# Altium footprint library Connectors.PcbLib: 67 footprints (part 4 of 5)
Each footprint in its own frame and in the unit in brackets; x right, y up, seen from the top. Pads: shape width x height; smd on the part's side, far side on the other; paste and mask are expansions set on the pad; w line width, h text height; cw(c..) or ccw(c..) is an arc to the next point about the centre after c.
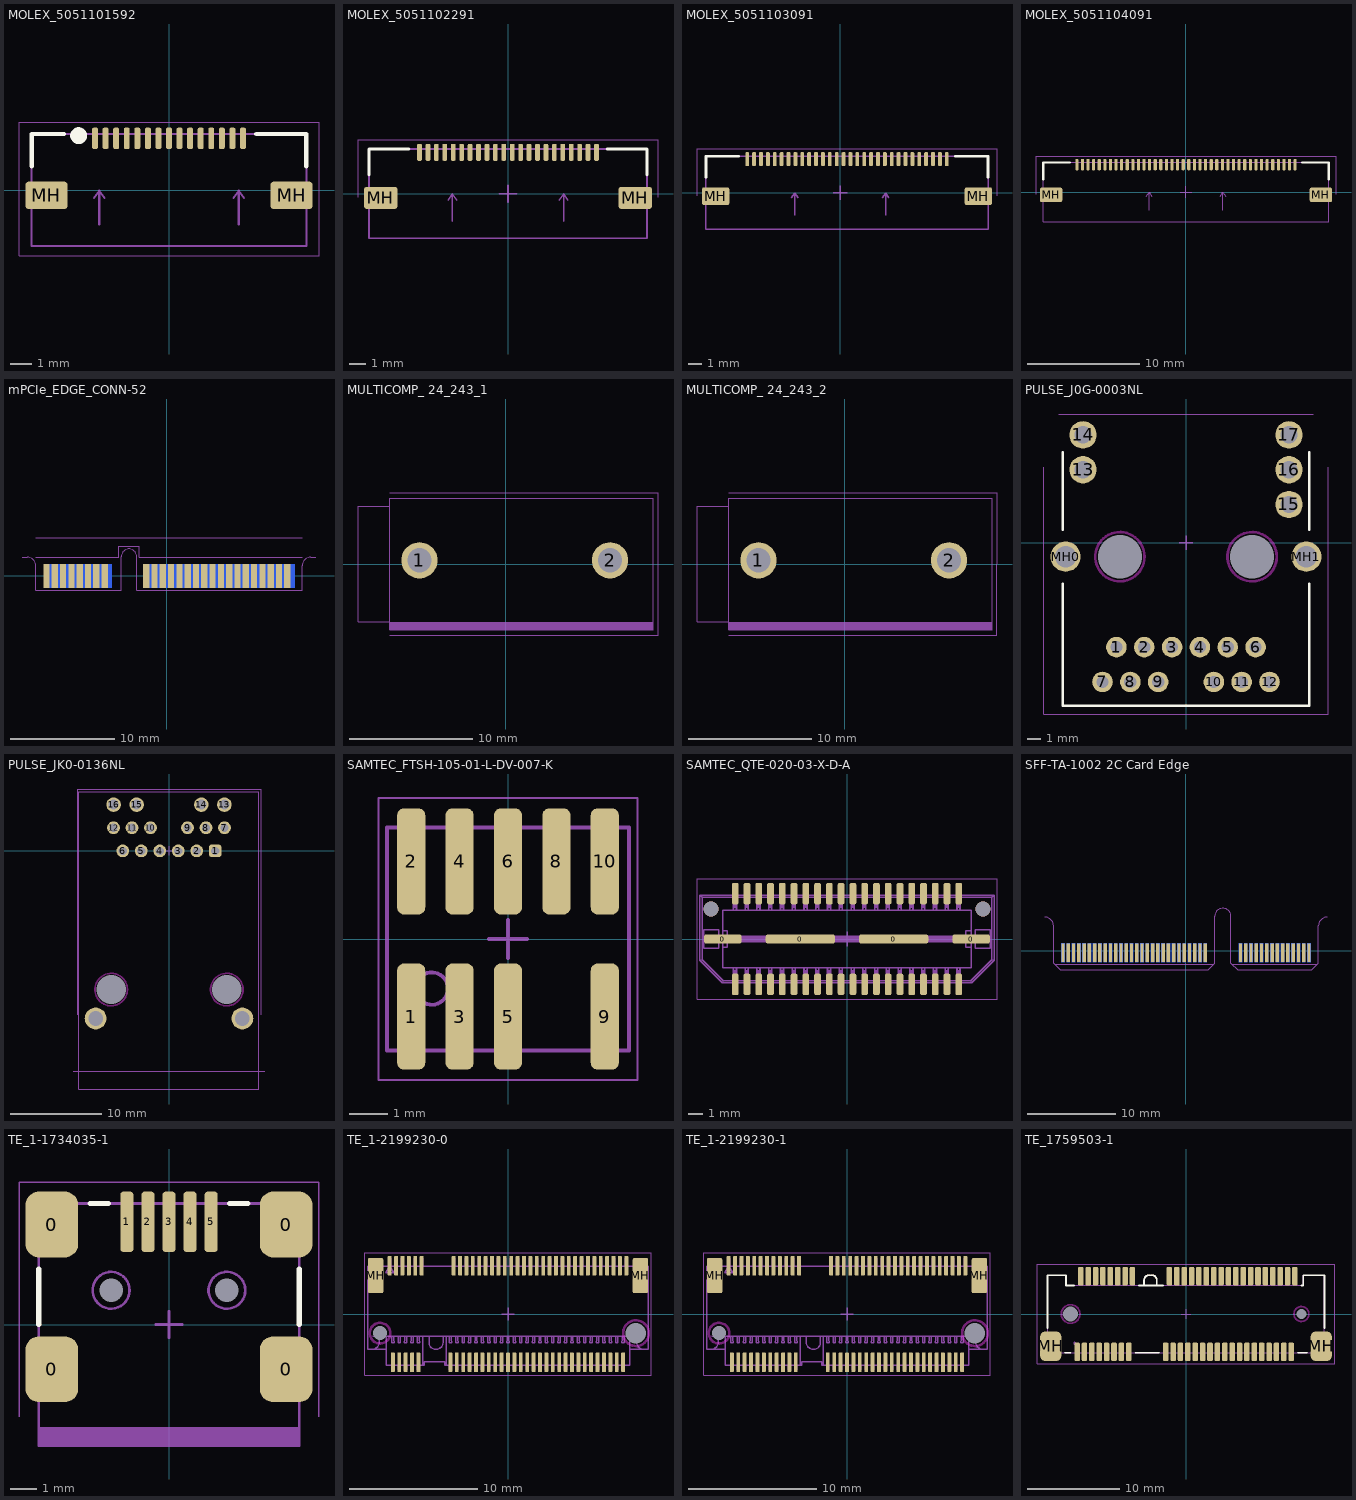
[diagram p3: the footprints below, top view; thin cyan lines are the x and y axes]

## MOLEX_5051101592 [mm]
pads (17):
  rrect50% 0.28x1 smd mask+0.05: 1(-3.5,2.45) 2(-3,2.45) 3(-2.5,2.45) 4(-2,2.45) 5(-1.5,2.45) 6(-1,2.45) 7(-0.5,2.45) 8(0,2.45) 9(0.5,2.45) 10(1,2.45) 11(1.5,2.45) 12(2,2.45) 13(2.5,2.45) 14(3,2.45) 15(3.5,2.45)
  rrect25% 2x1.3 smd mask+0.05: MH(-5.8,-0.25) MH(5.8,-0.25)
Top Overlay:
  circle w0.4: c-4.275,2.575 r0.2
  lines w0.2: -6.5,1.125 -6.5,2.65 -4.975,2.65 ; 4.125,2.65 6.5,2.65 6.5,1.125
Top Assembly:
  lines w0.1: -3.55,-0.375 -3.3,-0.025 ; -3.3,-1.625 -3.3,-0.025 ; -3.05,-0.375 -3.3,-0.025 ; 3.05,-0.375 3.3,-0.025 ; 3.3,-1.625 3.3,-0.025 ; 3.55,-0.375 3.3,-0.025 ; -6.5,-2.65 6.5,-2.65 6.5,2.65 -6.5,2.65 -6.5,-2.65
  text ".Designator" at -5.835,-0.571 h1.6
Top Courtyard (Mech13):
  lines w0.05: -7.1,-3.1 -7.1,3.2 7.1,3.2 7.1,-3.1 -7.1,-3.1
3D body "5051101592.stp": height 1.88, standoff -0.02, extent -6.5,-2.65 6.5,2.65

## MOLEX_5051102291 [mm]
height 1.9
pads (24):
  rrect50% 0.28x1 smd mask+0.05: 1(-5.25,2.45) 2(-4.75,2.45) 3(-4.25,2.45) 4(-3.75,2.45) 5(-3.25,2.45) 6(-2.75,2.45) 7(-2.25,2.45) 8(-1.75,2.45) 9(-1.25,2.45) 10(-0.75,2.45) 11(-0.25,2.45) 12(0.25,2.45) 13(0.75,2.45) 14(1.25,2.45) 15(1.75,2.45) 16(2.25,2.45) 17(2.75,2.45) 18(3.25,2.45) 19(3.75,2.45) 20(4.25,2.45) 21(4.75,2.45) 22(5.25,2.45)
  rrect25% 2x1.3 smd mask+0.05: MH(-7.55,-0.25) MH(7.55,-0.25)
Top Overlay:
  lines w0.2: -8.25,1.125 -8.25,2.65 -5.875,2.65 ; 5.875,2.65 8.25,2.65 8.25,1.125
Top Assembly:
  lines w0.1: -3.55,-0.375 -3.3,-0.025 ; -3.3,-1.625 -3.3,-0.025 ; -3.05,-0.375 -3.3,-0.025 ; 3.05,-0.375 3.3,-0.025 ; 3.3,-1.625 3.3,-0.025 ; 3.55,-0.375 3.3,-0.025 ; -8.25,-2.65 -8.25,2.65 8.25,2.65 8.25,-2.65 -8.25,-2.65
  text ".Designator" at -5.835,-0.571 h1.6
Top Courtyard (Mech13):
  lines w0.05: -8.9,-0.2 -8.9,3.2 8.9,3.2 8.9,-0.2
  lines w0.1: -0.5,0 0.5,0 ; 0,-0.5 0,0.5
3D body "5051102291.stp": height 1.88, standoff -0.02, extent -8.25,-2.65 8.25,2.65

## MOLEX_5051103091 [mm]
pads (32):
  rrect50% 0.28x1 smd mask+0.05: 1(-6.75,2.45) 2(-6.25,2.45) 3(-5.75,2.45) 4(-5.25,2.45) 5(-4.75,2.45) 6(-4.25,2.45) 7(-3.75,2.45) 8(-3.25,2.45) 9(-2.75,2.45) 10(-2.25,2.45) 11(-1.75,2.45) 12(-1.25,2.45) 13(-0.75,2.45) 14(-0.25,2.45) 15(0.25,2.45) 16(0.75,2.45) 17(1.25,2.45) 18(1.75,2.45) 19(2.25,2.45) 20(2.75,2.45) 21(3.25,2.45) 22(3.75,2.45) 23(4.25,2.45) 24(4.75,2.45) 25(5.25,2.45) 26(5.75,2.45) 27(6.25,2.45) 28(6.75,2.45) 29(7.25,2.45) 30(7.75,2.45)
  rrect25% 2x1.3 smd mask+0.05: MH(-9.05,-0.25) MH(10.05,-0.25)
Top Overlay:
  lines w0.2: -9.75,1.125 -9.75,2.65 -7.375,2.65 ; 8.375,2.65 10.75,2.65 10.75,1.125
Top Assembly:
  lines w0.1: -3.55,-0.375 -3.3,-0.025 ; -3.3,-1.625 -3.3,-0.025 ; -3.05,-0.375 -3.3,-0.025 ; 3.05,-0.375 3.3,-0.025 ; 3.3,-1.625 3.3,-0.025 ; 3.55,-0.375 3.3,-0.025 ; -9.75,-2.65 -9.75,2.65 10.75,2.65 10.75,-2.65 -9.75,-2.65
  text ".Designator" at -5.835,-0.571 h1.6
Top Courtyard (Mech13):
  lines w0.05: -10.4,-0.2 -10.4,3.2 11.4,3.2 11.4,-0.2
  lines w0.1: -0.5,0 0.5,0 ; 0,-0.5 0,0.5
3D body "5051103091.stp": height 1.88, standoff -0.02, extent -9.75,-2.65 10.75,2.65

## MOLEX_5051104091 [mm]
pads (42):
  rrect50% 0.28x1 smd mask+0.05: 1(-9.75,2.45) 2(-9.25,2.45) 3(-8.75,2.45) 4(-8.25,2.45) 5(-7.75,2.45) 6(-7.25,2.45) 7(-6.75,2.45) 8(-6.25,2.45) 9(-5.75,2.45) 10(-5.25,2.45) 11(-4.75,2.45) 12(-4.25,2.45) 13(-3.75,2.45) 14(-3.25,2.45) 15(-2.75,2.45) 16(-2.25,2.45) 17(-1.75,2.45) 18(-1.25,2.45) 19(-0.75,2.45) 20(-0.25,2.45) 21(0.25,2.45) 22(0.75,2.45) 23(1.25,2.45) 24(1.75,2.45) 25(2.25,2.45) 26(2.75,2.45) 27(3.25,2.45) 28(3.75,2.45) 29(4.25,2.45) 30(4.75,2.45) 31(5.25,2.45) 32(5.75,2.45) 33(6.25,2.45) 34(6.75,2.45) 35(7.25,2.45) 36(7.75,2.45) 37(8.25,2.45) 38(8.75,2.45) 39(9.25,2.45) 40(9.75,2.45)
  rrect25% 2x1.3 smd mask+0.05: MH(-12.05,-0.25) MH(12.05,-0.25)
Top Overlay:
  lines w0.2: -12.75,1.125 -12.75,2.65 -10.375,2.65 ; 10.375,2.65 12.75,2.65 12.75,1.125
Top Assembly:
  lines w0.1: -3.55,-0.375 -3.3,-0.025 ; -3.3,-1.625 -3.3,-0.025 ; -3.05,-0.375 -3.3,-0.025 ; 3.05,-0.375 3.3,-0.025 ; 3.3,-1.625 3.3,-0.025 ; 3.55,-0.375 3.3,-0.025 ; -12.75,-2.65 12.75,-2.65 12.75,2.65 -12.75,2.65 -12.75,-2.65
  text ".Designator" at -5.835,-0.571 h1.6
Top Courtyard (Mech13):
  lines w0.05: -13.4,-0.2 -13.4,3.2 13.4,3.2 13.4,-0.2
  lines w0.1: -0.5,0 0.5,0 ; 0,-0.5 0,0.5
3D body "5051104091.stp": height 1.88, standoff -0.02, extent -12.75,-2.65 12.75,2.65

## mPCIe_EDGE_CONN-52 [mm]
pads (52):
  rect 0.6x2.3 smd paste-10 mask+0.05: 1(-11.6,0) 3(-10.8,0) 5(-10,0) 7(-9.2,0) 9(-8.4,0) 11(-7.6,0) 13(-6.8,0) 15(-6,0) 17(-2,0) 19(-1.2,0) 21(-0.4,0) 23(0.4,0) 25(1.2,0) 27(2,0) 29(2.8,0) 31(3.6,0) 33(4.4,0) 35(5.2,0) 37(6,0) 39(6.8,0) 41(7.6,0) 43(8.4,0) 45(9.2,0) 47(10,0) 49(10.8,0) 51(11.6,0)
  rect 0.6x2.3 smd far side paste-10 mask+0.05: 2(-11.2,0) 4(-10.4,0) 6(-9.6,0) 8(-8.8,0) 10(-8,0) 12(-7.2,0) 14(-6.4,0) 16(-5.6,0) 18(-1.6,0) 20(-0.8,0) 22(0,0) 24(0.8,0) 26(1.6,0) 28(2.4,0) 30(3.2,0) 32(4,0) 34(4.8,0) 36(5.6,0) 38(6.4,0) 40(7.2,0) 42(8,0) 44(8.8,0) 46(9.6,0) 48(10.4,0) 50(11.2,0) 52(12,0)
Board:
  lines w0.05: -13.95,1.8 -13.45,1.8 cw(c-13.45,1) -12.65,1 ; 14.35,1.8 13.85,1.8 ccw(c13.85,1) 13.05,1 13.05,-1.4 -2.9,-1.4 -2.9,1.85 ccw(c-3.65,1.85) -4.4,1.85 -4.4,-1.4 -12.65,-1.4 -12.65,1 ; -12.65,1 -12.65,1
Top Courtyard (Mech13):
  lines w0.05: -12.65,3.7 13.05,3.7
Bottom Courtyard:
  lines w0.05: -12.65,1.8 -4.65,1.8 -4.65,2.85 -2.65,2.85 -2.65,1.8 13.05,1.8

## MULTICOMP_ 24_243_1 [mm]
height 0.3
pads (2):
  round 2.955 hole 1.97: 1(-7,0.3) 2(8.5,0.3)
Top Assembly:
  region: -9.4,-4.75 -9.4,-5.35 12,-5.35 12,-4.75
  lines w0.1: -9.4,-4.75 12,-4.75 ; -9.4,-4.7 -12,-4.7 -12,4.7 -9.4,4.7 ; -9.4,-5.35 -9.4,5.35 12,5.35 12,-5.35 -9.4,-5.35
  text ".Designator" at -0.346,0.121 h1
Top Courtyard (Mech13):
  lines w0.05: -9.4,-5.8 12.4,-5.8 12.4,5.8 -9.4,5.8
3D body "User Library-Multicomp_24_243_1.step": height 13, standoff -6, extent -12,-5.35 12,5.35

## MULTICOMP_ 24_243_2 [mm]
height 0.3
pads (2):
  round 2.955 hole 1.97: 1(-7,0.3) 2(8.5,0.3)
Top Assembly:
  region: -9.4,-4.75 -9.4,-5.35 12,-5.35 12,-4.75
  lines w0.1: -9.4,-4.75 12,-4.75 ; -9.4,-4.7 -12,-4.7 -12,4.7 -9.4,4.7 ; -9.4,-5.35 -9.4,5.35 12,5.35 12,-5.35 -9.4,-5.35
  text ".Designator" at -0.346,0.121 h1
Top Courtyard (Mech13):
  lines w0.05: -9.4,-5.8 12.4,-5.8 12.4,5.8 -9.4,5.8
3D body "User Library-Multicomp_24_243_2.step": height 13, standoff -6, extent -12,-5.35 12,5.35

## PULSE_J0G-0003NL [mm]
height 11.68
pads (21):
  round 0 hole 3.2 unplated mask+0.1: 0(-4.826,-1.016) 0(4.826,-1.016)
  round 1.5 hole 0.89 mask+0.05: 1(-5.08,-7.62) 2(-3.048,-7.62) 3(-1.016,-7.62) 4(1.016,-7.62) 5(3.048,-7.62) 6(5.08,-7.62) 7(-6.096,-10.16) 8(-4.064,-10.16) 9(-2.032,-10.16) 10(2.032,-10.16) 11(4.064,-10.16) 12(6.096,-10.16)
  round 2 hole 1.27 mask+0.05: 13(-7.518,5.334) 14(-7.518,7.874) 15(7.518,2.794) 16(7.518,5.334) 17(7.518,7.874)
  round 2.2 hole 1.57 mask+0.1: MH0(-8.788,-1.016) MH1(8.788,-1.016)
Top Overlay:
  lines w0.2: -9,-3 -9,-11.9 9,-11.9 9,-3 ; -9,0.968 -9,6.6 ; 9,0.968 9,6.6
Keep-Out Layer:
  circle w0.2: c-4.826,-1.016 r1.798
  circle w0.2: c4.826,-1.016 r1.798
Board:
  lines w0.05: -9.3,9.4 9.3,9.4
Top Assembly:
  text ".Designator" at -5.835,-0.571 h1.6
Top Courtyard (Mech13):
  lines w0.05: -10.4,5.5 -10.4,-12.5 10.4,-12.5 10.4,5.5
  lines w0.1: -0.5,0 0.5,0 ; 0,-0.5 0,0.5
3D body "J0G-0003NL_3D.STEP": height 11.35, standoff -3.51, extent -9.017,-11.938 9.017,12.615

## PULSE_JK0-0136NL [mm]
height 15
pads (20):
  rrect50% 1.4x1.4 hole 0.9 mask+0.05: 1(5.075,0)
  round 1.4 hole 0.9 mask+0.05: 2(3.045,0) 3(1.015,0) 4(-1.015,0) 5(-3.045,0) 6(-5.075,0) 7(6.095,2.54) 8(4.065,2.54) 9(2.035,2.54) 10(-2.035,2.54) 11(-4.065,2.54) 12(-6.095,2.54)
  round 1.6 hole 1.1 mask+0.05: 13(6.095,5.08) 14(3.555,5.08) 15(-3.555,5.08) 16(-6.095,5.08)
  round 0 hole 3.2 unplated mask+0.1: MH(-6.35,-15.24) MH(6.35,-15.24)
  round 2.4 hole 1.6 mask+0.1: SHIELD(-8.065,-18.42) SHIELD(8.065,-18.42)
Keep-Out Layer:
  circle w0.2: c-6.35,-15.24 r1.783
  circle w0.2: c6.35,-15.24 r1.783
Board:
  lines w0.05: -10.5,-24.2 10.5,-24.2
Top Assembly:
  lines w0.1: -9.9,-26.17 -9.9,6.52 -9.84,6.52 9.84,6.52 9.84,-26.17 -9.9,-26.17
  text ".Designator" at -5.835,-0.571 h1.6
Top Courtyard (Mech13):
  lines w0.05: -10.1,-18 -10.1,6.8 10.1,6.8 10.1,-18
  lines w0.1: -0.5,0 0.5,0 ; 0,-0.5 0,0.5
3D body "JK0-0136NL_3D.STEP": height 15.24, standoff -3.6, extent -9.839,-26.17 9.84,6.52

## SAMTEC_FTSH-105-01-L-DV-007-K [mm]
pads (9):
  rrect50% 0.74x2.79 smd mask+0.05: 1(-2.54,-2.035) 2(-2.54,2.035) 3(-1.27,-2.035) 4(-1.27,2.035) 5(0,-2.035) 6(0,2.035) 8(1.27,2.035) 9(2.54,-2.035) 10(2.54,2.035)
Top Assembly:
  circle w0.1: c-2,-1.3 r0.424
  lines w0.1: -3.175,-2.925 -3.175,2.925 3.175,2.925 3.175,-2.925 -3.175,-2.925
  text ".Designator" at -5.835,-0.571 h1.6
Top Courtyard (Mech13):
  lines w0.05: -3.4,-3.7 -3.4,3.7 3.4,3.7 3.4,-3.7 -3.4,-3.7
  lines w0.1: -0.5,0 0.5,0 ; 0,-0.5 0,0.5
3D body "FTSH-105-01-L-DV-007-K.stp": height 6.11, standoff -0.01, extent -3.175,-2.921 3.175,2.921

## SAMTEC_QTE-020-03-X-D-A [mm]
pads (46):
  rrect50% 2.54x0.64 smd mask+0.05: 0(-8.445,0) 0(8.445,0)
  rrect50% 4.7x0.64 smd mask+0.05: 0(-3.175,0) 0(3.175,0)
  rrect50% 0.46x1.45 smd mask+0.05: 1(-7.6,3.085) 2(-7.6,-3.085) 3(-6.8,3.085) 4(-6.8,-3.085) 5(-6,3.085) 6(-6,-3.085) 7(-5.2,3.085) 8(-5.2,-3.085) 9(-4.4,3.085) 10(-4.4,-3.085) 11(-3.6,3.085) 12(-3.6,-3.085) 13(-2.8,3.085) 14(-2.8,-3.085) 15(-2,3.085) 16(-2,-3.085) 17(-1.2,3.085) 18(-1.2,-3.085) 19(-0.4,3.085) 20(-0.4,-3.085) 21(0.4,3.085) 22(0.4,-3.085) 23(1.2,3.085) 24(1.2,-3.085) 25(2,3.085) 26(2,-3.085) 27(2.8,3.085) 28(2.8,-3.085) 29(3.6,3.085) 30(3.6,-3.085) 31(4.4,3.085) 32(4.4,-3.085) 33(5.2,3.085) 34(5.2,-3.085) 35(6,3.085) 36(6,-3.085) 37(6.8,3.085) 38(6.8,-3.085) 39(7.6,3.085) 40(7.6,-3.085)
  round 1.02 hole 1.02 unplated mask+0.12: ""(-9.24,2.04) ""(9.24,2.04)
Top Assembly:
  drawing of 1274 lines, arcs and shapes, not listed
  text ".Designator" at -5.835,-0.571 h1.6
Top Courtyard (Mech13):
  lines w0.05: -10.2,-4.1 10.2,-4.1 10.2,4.1 -10.2,4.1 -10.2,-4.1
  lines w0.1: -0.5,0 0.5,0 ; 0,-0.5 0,0.5
3D body "QTE-020-03-L-D-A.stp": height 10.27, standoff -0.71, extent -10.008,-3.556 10.008,3.556

## SFF-TA-1002 2C Card Edge [mm]
pads (84):
  rect 0.38x2.12 smd far side paste-10 mask+0.1: A1(-13.965,-0.2) A2(-13.365,-0.2) A3(-12.765,-0.2) A4(-12.165,-0.2) A5(-11.565,-0.2) A6(-10.965,-0.2) A7(-10.365,-0.2) A8(-9.765,-0.2) A9(-9.165,-0.2) A10(-8.565,-0.2) A11(-7.965,-0.2) A12(-7.365,-0.2) A13(-6.765,-0.2) A14(-6.165,-0.2) A15(-5.565,-0.2) A16(-4.965,-0.2) A17(-4.365,-0.2) A18(-3.765,-0.2) A19(-3.165,-0.2) A20(-2.565,-0.2) A21(-1.965,-0.2) A22(-1.365,-0.2) A23(-0.765,-0.2) A24(-0.165,-0.2) A25(0.435,-0.2) A26(1.035,-0.2) A27(1.635,-0.2) A28(2.235,-0.2) A29(6.245,-0.2) A30(6.845,-0.2) A31(7.445,-0.2) A32(8.045,-0.2) A33(8.645,-0.2) A34(9.245,-0.2) A35(9.845,-0.2) A36(10.445,-0.2) A37(11.045,-0.2) A38(11.645,-0.2) A39(12.245,-0.2) A40(12.845,-0.2) A41(13.445,-0.2) A42(14.045,-0.2)
  rect 0.38x2.12 smd paste-10 mask+0.1: B1(-13.965,-0.2) B2(-13.365,-0.2) B3(-12.765,-0.2) B4(-12.165,-0.2) B5(-11.565,-0.2) B6(-10.965,-0.2) B7(-10.365,-0.2) B8(-9.765,-0.2) B9(-9.165,-0.2) B10(-8.565,-0.2) B11(-7.965,-0.2) B12(-7.365,-0.2) B13(-6.765,-0.2) B14(-6.165,-0.2) B15(-5.565,-0.2) B16(-4.965,-0.2) B17(-4.365,-0.2) B18(-3.765,-0.2) B19(-3.165,-0.2) B20(-2.565,-0.2) B21(-1.965,-0.2) B22(-1.365,-0.2) B23(-0.765,-0.2) B24(-0.165,-0.2) B25(0.435,-0.2) B26(1.035,-0.2) B27(1.635,-0.2) B28(2.235,-0.2) B29(6.245,-0.2) B30(6.845,-0.2) B31(7.445,-0.2) B32(8.045,-0.2) B33(8.645,-0.2) B34(9.245,-0.2) B35(9.845,-0.2) B36(10.445,-0.2) B37(11.045,-0.2) B38(11.645,-0.2) B39(12.245,-0.2) B40(12.845,-0.2) B41(13.445,-0.2) B42(14.045,-0.2)
Top Solder:
  region: -15.045,2.86 -15.045,-1.39 -14.295,-2.14 2.565,-2.14 3.315,-1.39 3.315,2.86
  region: 15.125,2.86 15.125,-1.39 14.375,-2.14 5.915,-2.14 5.165,-1.39 5.165,2.86
Bottom Solder:
  region: 15.125,2.86 15.125,-1.39 14.375,-2.14 5.915,-2.14 5.165,-1.39 5.165,2.86
  region: -15.045,2.86 -15.045,-1.39 -14.295,-2.14 2.565,-2.14 3.315,-1.39 3.315,2.86
Top Assembly:
  lines w0.1: -16.045,3.86 cw(c-16.045,2.86) -15.045,2.86 -15.045,-1.39 -14.295,-2.14 2.565,-2.14 3.315,-1.39 3.315,3.935 cw(c4.24,3.935) 5.165,3.935 5.165,-1.39 5.915,-2.14 14.375,-2.14 15.125,-1.39 15.125,2.86 cw(c16.125,2.86) 16.125,3.86 ; -14.915,-1.52 3.185,-1.52 ; 5.295,-1.52 14.995,-1.52
Bottom Assembly:
  lines w0.1: -16.045,3.86 cw(c-16.045,2.86) -15.045,2.86 -15.045,-1.39 -14.295,-2.14 2.565,-2.14 3.315,-1.39 3.315,3.935 cw(c4.24,3.935) 5.165,3.935 5.165,-1.39 5.915,-2.14 14.375,-2.14 15.125,-1.39 15.125,2.86 cw(c16.125,2.86) 16.125,3.86

## TE_1-1734035-1 [mm]
pads (11):
  rrect50% 2x2.5 smd mask+0.05: 0(-4.45,-1.7) 0(-4.45,3.8) 0(4.45,-1.7) 0(4.45,3.8)
  rrect50% 0.5x2.3 smd mask+0.05: 1(-1.6,3.9) 2(-0.8,3.9) 3(0,3.9) 4(0.8,3.9) 5(1.6,3.9)
  round 0 hole 0.9 unplated mask+0.1: MH(-2.2,1.3) MH(2.2,1.3)
Top Overlay:
  lines w0.2: -4.95,0 -4.95,2.1 ; -3,4.6 -2.3,4.6 ; 2.3,4.6 3,4.6 ; 4.95,0 4.95,2.1
Board:
  lines w0.05: -4.95,-3.95 4.95,-3.95
Top Assembly:
  circle w0.1: c2.2,1.3 r0.7
  circle w0.1: c-2.2,1.3 r0.7
  region: -4.95,-3.95 -4.95,-4.6 4.95,-4.6 4.95,-3.95
  lines w0.1: -4.95,-3.95 4.95,-3.95 ; -4.95,-4.6 4.95,-4.6 4.95,4.6 -4.95,4.6 -4.95,-4.6
  text ".Designator" at -5.835,-0.571 h1.6
Top Courtyard (Mech13):
  lines w0.05: -5.7,-3.5 -5.7,5.4 5.7,5.4 5.7,-3.5
  lines w0.1: -0.5,0 0.5,0 ; 0,-0.5 0,0.5
3D body "c-1734035-1-f-3d.x_t": height 4.14, standoff -0.95, extent -4.95,-4.6 4.95,4.6

## TE_1-2199230-0 [mm]
pads (71):
  rrect50% 0.3x1.55 smd mask+0.05: 1(-9.25,3.775) 2(-9,-3.775) 3(-8.75,3.775) 4(-8.5,-3.775) 5(-8.25,3.775) 6(-8,-3.775) 7(-7.75,3.775) 8(-7.5,-3.775) 9(-7.25,3.775) 10(-7,-3.775) 11(-6.75,3.775) 20(-4.5,-3.775) 21(-4.25,3.775) 22(-4,-3.775) 23(-3.75,3.775) 24(-3.5,-3.775) 25(-3.25,3.775) 26(-3,-3.775) 27(-2.75,3.775) 28(-2.5,-3.775) 29(-2.25,3.775) 30(-2,-3.775) 31(-1.75,3.775) 32(-1.5,-3.775) 33(-1.25,3.775) 34(-1,-3.775) 35(-0.75,3.775) 36(-0.5,-3.775) 37(-0.25,3.775) 38(0,-3.775) 39(0.25,3.775) 40(0.5,-3.775) 41(0.75,3.775) 42(1,-3.775) 43(1.25,3.775) 44(1.5,-3.775) 45(1.75,3.775) 46(2,-3.775) 47(2.25,3.775) 48(2.5,-3.775) 49(2.75,3.775) 50(3,-3.775) 51(3.25,3.775) 52(3.5,-3.775) 53(3.75,3.775) 54(4,-3.775) 55(4.25,3.775) 56(4.5,-3.775) 57(4.75,3.775) 58(5,-3.775) 59(5.25,3.775) 60(5.5,-3.775) 61(5.75,3.775) 62(6,-3.775) 63(6.25,3.775) 64(6.5,-3.775) 65(6.75,3.775) 66(7,-3.775) 67(7.25,3.775) 68(7.5,-3.775) 69(7.75,3.775) 70(8,-3.775) 71(8.25,3.775) 72(8.5,-3.775) 73(8.75,3.775) 74(9,-3.775) 75(9.25,3.775)
  rrect20% 1.2x2.75 smd mask+0.05: MH(-10.35,3) MH(10.35,3)
  round 0 hole 1.1 unplated mask+0.1: MH(-10,-1.5)
  round 0 hole 1.6 unplated mask+0.1: MH(10,-1.5)
Keep-Out Layer:
  circle w0.2: c10,-1.5 r1.005
  circle w0.2: c-10,-1.5 r0.806
Top Assembly:
  drawing of 599 lines, arcs and shapes, not listed
  text ".Designator" at -5.835,-0.571 h1.6
Top Courtyard (Mech13):
  lines w0.05: -11.2,-4.8 -11.2,4.8 11.2,4.8 11.2,-4.8 -11.2,-4.8
  lines w0.1: -0.5,0 0.5,0 ; 0,-0.5 0,0.5
3D body "c-1-2199230-0-b3-3d_shifted.stp": height 4.1, standoff -0.6, extent -10.95,-4.35 10.95,4.35

## TE_1-2199230-1 [mm]
pads (71):
  rrect50% 0.3x1.55 smd mask+0.05: 1(-9.25,3.775) 2(-9,-3.775) 3(-8.75,3.775) 4(-8.5,-3.775) 5(-8.25,3.775) 6(-8,-3.775) 7(-7.75,3.775) 8(-7.5,-3.775) 9(-7.25,3.775) 10(-7,-3.775) 11(-6.75,3.775) 12(-6.5,-3.775) 13(-6.25,3.775) 14(-6,-3.775) 15(-5.75,3.775) 16(-5.5,-3.775) 17(-5.25,3.775) 18(-5,-3.775) 19(-4.75,3.775) 20(-4.5,-3.775) 21(-4.25,3.775) 22(-4,-3.775) 23(-3.75,3.775) 32(-1.5,-3.775) 33(-1.25,3.775) 34(-1,-3.775) 35(-0.75,3.775) 36(-0.5,-3.775) 37(-0.25,3.775) 38(0,-3.775) 39(0.25,3.775) 40(0.5,-3.775) 41(0.75,3.775) 42(1,-3.775) 43(1.25,3.775) 44(1.5,-3.775) 45(1.75,3.775) 46(2,-3.775) 47(2.25,3.775) 48(2.5,-3.775) 49(2.75,3.775) 50(3,-3.775) 51(3.25,3.775) 52(3.5,-3.775) 53(3.75,3.775) 54(4,-3.775) 55(4.25,3.775) 56(4.5,-3.775) 57(4.75,3.775) 58(5,-3.775) 59(5.25,3.775) 60(5.5,-3.775) 61(5.75,3.775) 62(6,-3.775) 63(6.25,3.775) 64(6.5,-3.775) 65(6.75,3.775) 66(7,-3.775) 67(7.25,3.775) 68(7.5,-3.775) 69(7.75,3.775) 70(8,-3.775) 71(8.25,3.775) 72(8.5,-3.775) 73(8.75,3.775) 74(9,-3.775) 75(9.25,3.775)
  rrect20% 1.2x2.75 smd mask+0.05: MH(-10.35,3) MH(10.35,3)
  round 0 hole 1.1 unplated mask+0.1: MH(-10,-1.5)
  round 0 hole 1.6 unplated mask+0.1: MH(10,-1.5)
Keep-Out Layer:
  circle w0.2: c10,-1.5 r1.005
  circle w0.2: c-10,-1.5 r0.806
Top Assembly:
  drawing of 599 lines, arcs and shapes, not listed
  text ".Designator" at -5.835,-0.571 h1.6
Top Courtyard (Mech13):
  lines w0.05: -11.2,-4.8 11.2,-4.8 11.2,4.8 -11.2,4.8 -11.2,-4.8
  lines w0.1: -0.5,0 0.5,0 ; 0,-0.5 0,0.5
3D body "c-1-2199230-1-b3-3d_shifted.stp": height 4.1, standoff -0.6, extent -10.95,-4.35 10.95,4.35

## TE_1759503-1 [mm]
height 8
pads (56):
  rrect50% 0.6x2 smd mask+0.05: 1(-11.8,-4.1) 2(-11.4,4.1) 3(-11,-4.1) 4(-10.6,4.1) 5(-10.2,-4.1) 6(-9.8,4.1) 7(-9.4,-4.1) 8(-9,4.1) 9(-8.6,-4.1) 10(-8.2,4.1) 11(-7.8,-4.1) 12(-7.4,4.1) 13(-7,-4.1) 14(-6.6,4.1) 15(-6.2,-4.1) 16(-5.8,4.1) 17(-2.2,-4.1) 18(-1.8,4.1) 19(-1.4,-4.1) 20(-1,4.1) 21(-0.6,-4.1) 22(-0.2,4.1) 23(0.2,-4.1) 24(0.6,4.1) 25(1,-4.1) 26(1.4,4.1) 27(1.8,-4.1) 28(2.2,4.1) 29(2.6,-4.1) 30(3,4.1) 31(3.4,-4.1) 32(3.8,4.1) 33(4.2,-4.1) 34(4.6,4.1) 35(5,-4.1) 36(5.4,4.1) 37(5.8,-4.1) 38(6.2,4.1) 39(6.6,-4.1) 40(7,4.1) 41(7.4,-4.1) 42(7.8,4.1) 43(8.2,-4.1) 44(8.6,4.1) 45(9,-4.1) 46(9.4,4.1) 47(9.8,-4.1) 48(10.2,4.1) 49(10.6,-4.1) 50(11,4.1) 51(11.4,-4.1) 52(11.8,4.1)
  rrect50% 2.3x3.2 smd mask+0.05: MH(-14.65,-3.5) MH(14.65,-3.5)
  round 0 hole 1.6 unplated mask+0.1: MH(-12.5,0)
  round 0 hole 1.1 unplated mask+0.1: MH(12.5,0)
Top Overlay:
  lines w0.2: -15,-1.5 -15,4.2 -13,4.2 -13,3.1 -12.1,3.1 ; -13.1,-4.2 -12.5,-4.2 ; -5.5,-4.2 -2.9,-4.2 ; -5.1,3.1 -2.5,3.1 ; -4.535,3.1 -4.535,3.7 ; -4.535,3.701 cw(c-4.018,3.682) -3.999,4.2 ; -4,4.2 -3.7,4.2 ; -3.701,4.2 cw(c-3.682,3.682) -3.165,3.701 ; -3.165,3.1 -3.165,3.7 ; 12.1,-4.2 13.1,-4.2 ; 12.5,3.1 12.7,3.1 12.7,4.2 15,4.2 15,-1.5
Keep-Out Layer:
  circle w0.2: c12.5,0 r0.806
  circle w0.2: c-12.5,0 r1.005
Top Assembly:
  circle w0.1: c-12.065,-3.175 r0.1
  lines w0.1: -4.535,3.7 -4.535,3.1 ; -4.535,3.701 cw(c-4.018,3.682) -3.999,4.2 ; -4,4.2 -3.7,4.2 ; -3.701,4.2 cw(c-3.682,3.682) -3.165,3.701 ; -3.165,3.7 -3.165,3.1 ; -4.535,3.1 -3.165,3.1 ; -4.535,3.1 -13,3.1 -13,4.2 -15,4.2 -15,-4.2 15,-4.2 15,4.2 12.7,4.2 12.7,3.1 -3.165,3.1
  text ".Designator" at -5.835,-0.571 h1.6
Top Courtyard (Mech13):
  lines w0.05: -16.1,-5.4 -16.1,5.4 16.1,5.4 16.1,-5.4 -16.1,-5.4
  lines w0.1: -0.5,0 0.5,0 ; 0,-0.5 0,0.5
3D body "c-1759503-1-d-3d.stp": height 8.01, standoff -0.67, extent -15,-4.61 15,4.61